# Altium schematic symbol library lib_datalogger.SchLib: 1246 symbols (part 10 of 16) (continued)
## CMP-013-00003-3 (continued)
PNP General-Purpose Amplifier, 40 V, 0.2 A, -55 to 150 degC, 3-Pin SOT23, RoHS, Tape and Reel; Manufacturer: ON Semiconductor; Power: 225mW; Frequency: 250MHz; hFE Min: 80; Vce Max: 400mV; Elements: 1; Packaging: TapeandReel; Max Operating Temperature: 150°C; Datasheet URL: http://www.onsemi.cn/pub_link/Collateral/MMBT3906LT1-D.PDF; Pins: 3; Package Quantity: 3000; Package Description: 3-Pin Small Outline Transistor, Body 2.9 x 1.3 mm, Pitch 0.95 mm; Mounting Technology: SM; Datasheet Version: Rev. 12, 10/2016; Package Reference: SOT-23 (318-08); RoHS Compliant: True; Min Operating Temperature: -55°C; Case/Package: TO-236-3
footprint ONSC-SOT-23-3-318-08_V (SOT23, 3-Leads, Body 3.04x1.4mm, Pitch 0.95mm)
pins: 1 B, 2 E, 3 C

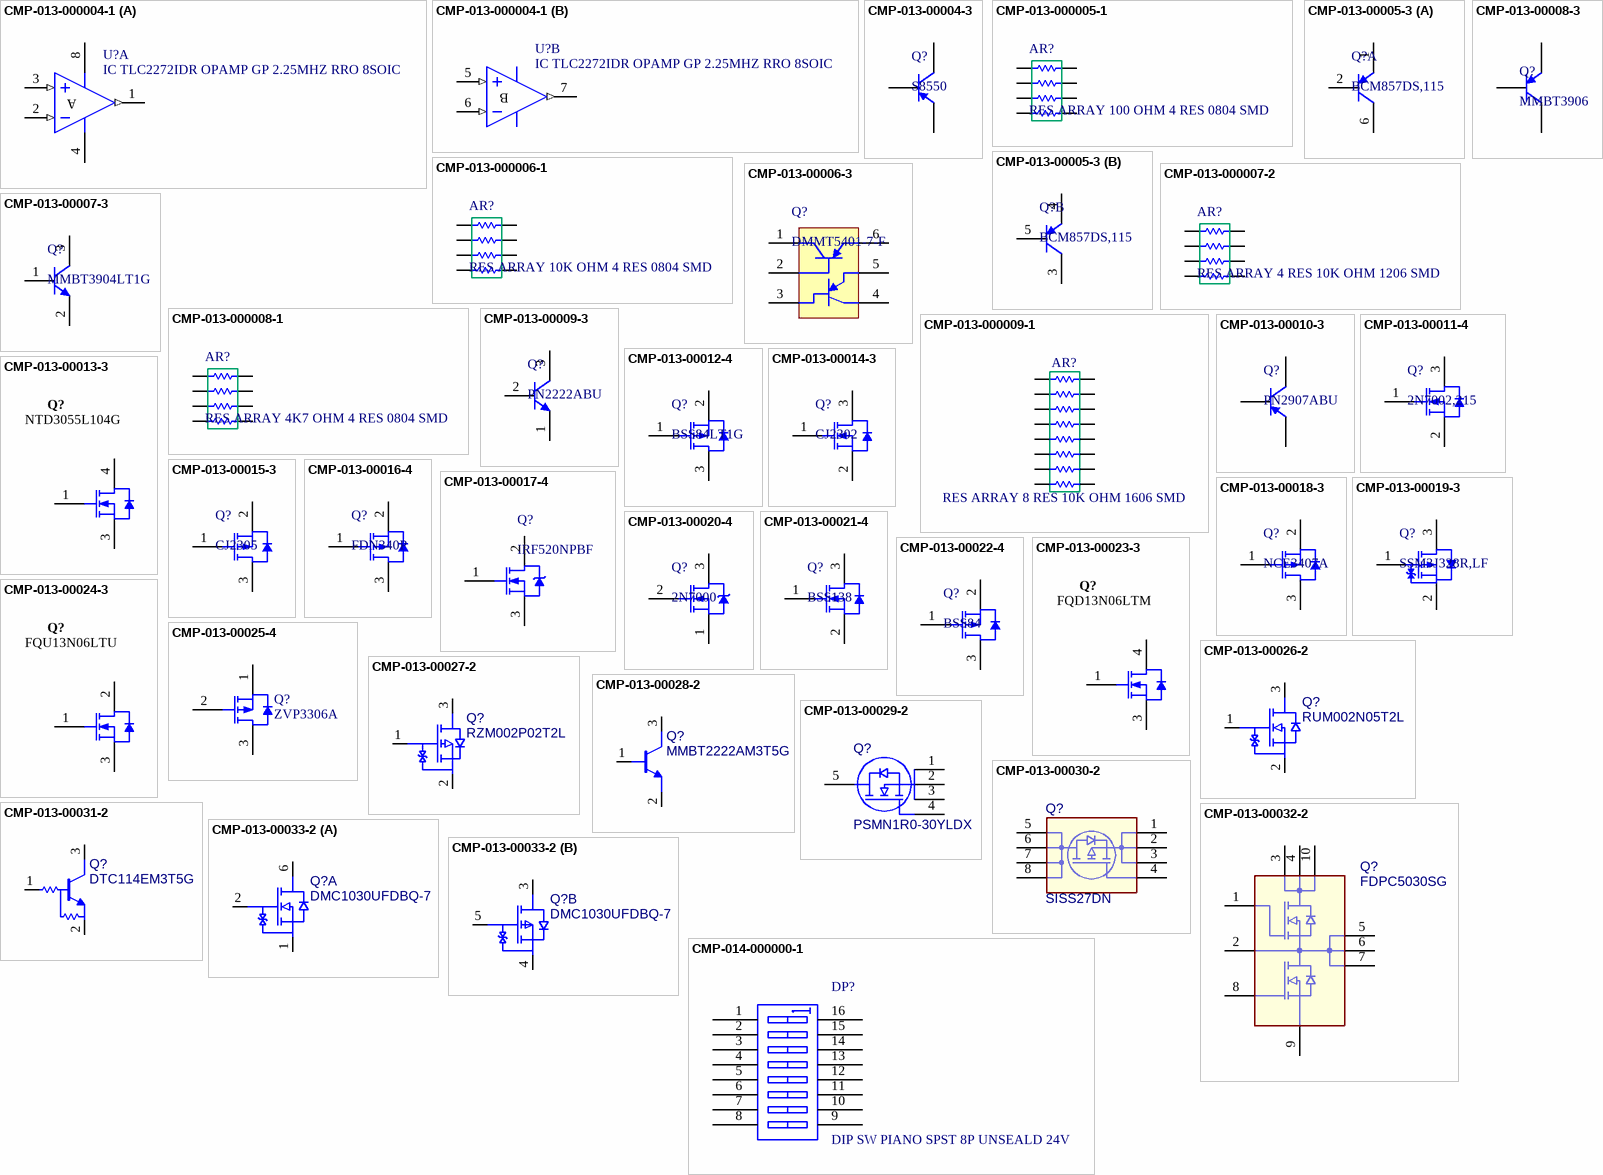
[diagram p29: symbols CMP-013-000004-1 to CMP-014-000000-1]

## CMP-013-000004-1
designator U?, comment IC TLC2272IDR OPAMP GP 2.25MHZ RRO 8SOIC
IC OPAMP GP 2.25MHZ RRO 8SOIC; Manufacturer: Texas Instruments; Amplifier Type: General Purpose; Voltage - Supply, Single/Dual (±): 4.4 V ~ 16 V, ±2.2 V ~ 8 V; Slew Rate: 3.6 V/µs; Output Type: Rail-to-Rail; Voltage - Input Offset: 300µV; Current - Output / Channel: 50mA; Number of Circuits: 2; Current - Input Bias: 1pA; Current - Supply: 2.4mA; ComponentLink1URL: http://www.ti.com/lit/ds/symlink/tlc2274.pdf; Part Status: Active; Packaging: Cut Tape (CT); Design Item ID: IC TLC2272IDR OPAMP GP 2.25MHZ RRO 8SOIC; Supplier Device Package: 8-SOIC; Manufacturer Part Number: TLC2272IDR; ComponentLink1Description: http://www.ti.com/lit/ds/symlink/tlc2274.pdf; Gain Bandwidth Product: 2.25MHz; Pricing 1: 1=1.75, 10=1.572, 100=1.2614, 500=1.0368, 1000=0.85824 (USD); Category: Integrated Circuits (ICs); Package / Case: 8-SOIC (0.154", 3.90mm Width); -3db Bandwidth: -; Operating Temperature: -40°C ~ 125°C; Mounting Type: Surface Mount; Stock 1: 3804; RoHS: RoHS Compliant; Source: mits.SchLib
footprint SOIC-8
footprint SOIC-8
part A pins: 1 1OUT (out), 2 1IN- (in), 3 1IN+ (in), 4 GND (power), 8 VCC (power)
part B pins: 5 2IN+ (in), 6 2IN- (in), 7 2OUT (out)
part A text: A
part B text: B

## CMP-013-00004-3
designator Q?, comment S8550
Low Voltage High Current Small Signal PNP Transistor, 20 V, 700 mA, 3-Pin TO-92, RoHS; Manufacturer: Unisonic; Mounting Technology: TH; Package Description: 3-Pin Through Hole Device, Dia 4.58 mm, Pitch 1.27 mm; Datasheet URL: http://media.nkcelectronics.com/datasheet/s8550.pdf; Case/Package: TO-92-3; Datasheet Version: Rev. E, 06/2014; Package Reference: TO-92-3; RoHS Compliant: Unknown
footprint UNIC-TO-92-3 (TO-92, 3-Leads, Dia 4.58mm, Pitch 1.27mm)
pins: 1 E, 2 B, 3 C

## CMP-013-000005-1
designator AR?, comment RES ARRAY 100 OHM 4 RES 0804 SMD
RES ARRAY 100 OHM 4 RES 0804; Manufacturer Part Number 1: YC124-FR-07100RL; Manufacturer 1: Yageo; Resistance: 100R; Tolerance: 1%; Number of Terminals/Pins: 8; Number of Resistors: 4; eVendorPrice: 0,0106; Temperature Coefficient: 200ppm/°C; Circuit Type: Isolated; Power Per Element: 62.5mW; eVendor: LCSC; Termination: Convex; Category: Resistor Arrays; Mount: Surface Mount; Terminal Pitch: 0.5mm; Depth: 1mm; Packaging: Tape and Reel; Design Item ID: RES ARRAY 100 OHM 4 RES 0804 SMD; Case/Package: 0804; RoHS Compliant: Yes; Lead Free: Lead Free; Observação: --; MOQ: 4600; Military Standard: Not; Source: mits.SchLib; Max Operating Temperature: 155°C; Min Operating Temperature: -55°C; Width: 0.039inch; Length: 0.079inch; Number of Circuits: 4; eVendor#: YC124-FR-07100RL; Height: 0.022inch; Part#: YC124-FR-07100RL; Number of Pins: 8
footprint Array_4Res-0804
footprint Array_4Res-0804
pins: 1, 2, 3, 4, 5, 6, 7, 8

## CMP-013-00005-3
designator Q?, comment BCM857DS,115
PNP/PNP Matched Double Transistors, 175 MHz, -65 to 150 degC, 6-Pin SOT457, RoHS, Tape and Reel; Manufacturer: NXP; Power: 380mW; Package Version: Feb-16; Vce Max: 400mV; hFE Min: 200; Tolerance: 5%; Frequency: 175MHz; Packaging: TapeandReel; Package Description: 6-Pin Small Outline Transistor, Body 2.9 x 1.5 mm, Pitch 0.95 mm; Max Operating Temperature: 150°C; Mounting Technology: SM; Case/Package: SOT-457; Pins: 6; Min Operating Temperature: -65°C; RoHS Compliant: True; Datasheet URL: http://cache.nxp.com/documents/data_sheet/BCM857BV_BS_DS.pdf?pspll=1; Datasheet Version: Rev. 06, 08/2009; Package Reference: SOT457-6; Package Quantity: 3000
footprint NXP-SOT457-6_V (SOT457, 6-Leads, Body 3.1x1.7mm, Pitch 0.95mm)
part A pins: 1 E1 "emitter TR1", 2 B1 "base TR1", 6 C1 "collector TR1"
part B pins: 3 C2 "collector TR2", 4 E2 "emitter TR2", 5 B2 "base TR2"

## CMP-013-000006-1
designator AR?, comment RES ARRAY 10K OHM 4 RES 0804 SMD
RES ARRAY 10K OHM 4 RES 0804; Part#: YC124-JR-0710KL; Manufacturer: Yageo; eVendor: Digi-Key; eVendor#: YC124J-10KCT-ND; MSRP: 0,00999; eVendorPrice: 0,10; Source: mits.SchLib; Datasheet: http://www.yageo.com/documents/recent/PYu-YC_TC124_51_RoHS_L_(3).pdf; Observação: --; MOQ: 5000; Design Item ID: RES ARRAY 10K OHM 4 RES 0804 SMD
footprint Array_4Res-0804
footprint Array_4Res-0804
pins: 1, 2, 3, 4, 5, 6, 7, 8

## CMP-013-00006-3
designator Q?, comment DMMT5401-7-F
Matched PNP Small Signal Surface Mount Transistor, 300 mW, -55 to 150 degC, 6-Pin SOT-26, RoHS, Tape and Reel; Manufacturer: Diodes Inc; Frequency: 300MHz; hFE Min: 60; Power: 300mW; Vce Max: 500mV; Elements: 2; Mounting Technology: SM; Package Quantity: 3000; Package Reference: SOT-26-6; Datasheet URL: http://www.diodes.com/_files/datasheets/ds30437.pdf; Min Operating Temperature: -55°C; Datasheet Version: Rev. 6-2, 05/2009; Pins: 6; Package Description: 6-Pin Small Outline Transistor, Body 1.6 x 3 mm, Pitch 0.95 mm; RoHS Compliant: True; Max Operating Temperature: 150°C; Case/Package: SOT-26; Packaging: TapeandReel
footprint DIOD-SOT-26-6_L (SOT23, 6-Leads, Body 3.1x1.7mm, Pitch 0.95mm, IPC High Density)
footprint DIOD-SOT-26-6_N (SOT23, 6-Leads, Body 3.1x1.7mm, Pitch 0.95mm, IPC Medium Density)
footprint DIOD-SOT-26-6_M (SOT23, 6-Leads, Body 3.1x1.7mm, Pitch 0.95mm, IPC Low Density)
pins: 1 C1, 2 B1, 3 B2, 4 C2, 5 E2, 6 E1

## CMP-013-000007-2
designator AR?, comment RES ARRAY 4 RES 10K OHM 1206 SMD
RES ARRAY 4 RES 10K OHM 1206; Manufacturer: Panasonic Electronic Components; Manufacturer Part Number: EXB-38V103JV; Power Per Element: 62.5mW; Tolerance: ±5%; Temperature Coefficient: ±200ppm/°C; Number of Resistors: 4; Circuit Type: Isolated; Package / Case: 1206 (3216 Metric), Convex, Long Side Terminals; Category: Resistors; Operating Temperature: -55°C ~ 125°C; Design Item ID: RES ARRAY 4 RES 10K OHM 1206 SMD; Mounting Type: Surface Mount; Size / Dimension: 0.126" L x 0.063" W (3.20mm x 1.60mm); Packaging: Cut Tape (CT); Part Status: Active; ComponentLink1URL: https://industrial.panasonic.com/cdbs/www-data/pdf/AOC0000/AOC0000CE4.pdf; Applications: Automotive AEC-Q200; Resistance (Ohms): 10k; Supplier Device Package: 1206; Stock 1: 318916; Number of Pins: 8; ComponentLink1Description: https://industrial.panasonic.com/cdbs/www-data/pdf/AOC0000/AOC0000CE4.pdf; RoHS: RoHS Compliant; Pricing 1: 1=0.1, 10=0.051, 25=0.0368, 50=0.0282, 100=0.0208, 250=0.01584, 500=0.01268, 1000=0.00933 (USD); Height - Seated (Max): 0.024" (0.60mm); Source: mits.SchLib
footprint Array_4Res-0804
footprint Array_4Res-1206
pins: 1, 2, 3, 4, 5, 6, 7, 8

## CMP-013-00007-3
designator Q?, comment MMBT3904LT1G
General Purpose Transistor, NPN Silicon, 40 V, 0.2 A, -55 to 150 degC, 3-Pin SOT23, RoHS, Tape and Reel; Manufacturer: ON Semiconductor; Elements: 1; Power: 225mW; Frequency: 300MHz; hFE Min: 80; Vce Max: 300mV; Mounting Technology: SM; Min Operating Temperature: -55°C; Datasheet URL: http://www.onsemi.cn/pub_link/Collateral/MMBT3904LT1-D.PDF; Pins: 3; Package Description: 3-Pin Small Outline Transistor, Body 2.9 x 1.3 mm, Pitch 0.95 mm; Max Operating Temperature: 150°C; Package Reference: SOT-23 (318-08); Package Quantity: 3000; RoHS Compliant: True; Packaging: TapeandReel; Datasheet Version: Rev. 12, 11/2012; Case/Package: TO-236-3
footprint ONSC-SOT-23-3-318-08_V (SOT23, 3-Leads, Body 3.04x1.4mm, Pitch 0.95mm)
pins: 1 B, 2 E, 3 C

## CMP-013-000008-1
designator AR?, comment RES ARRAY 4K7 OHM 4 RES 0804 SMD
RES ARRAY 4.7K OHM 4 RES 0804; Manufacturer: Yageo; Part#: YC124-JR-074K7L; MSRP: 0,00999; eVendorPrice: 0,10; eVendor#: YC124J-4.7KCT-ND; eVendor: Digi-Key; Design Item ID: RES ARRAY 4K7 OHM 4 RES 0804 SMD; Datasheet: http://www.yageo.com/documents/recent/PYu-YC_TC124_51_RoHS_L_(3).pdf; Observação: --; Source: mits.SchLib; MOQ: 5000
footprint Array_4Res-0804
footprint Array_4Res-0804
pins: 1, 2, 3, 4, 5, 6, 7, 8

## CMP-013-00008-3
designator Q?, comment MMBT3906
PNP General-Purpose Amplifier, 40 V, 0.2 A, -55 to 150 degC, 3-Pin SOT23, RoHS, Tape and Reel; Manufacturer: Fairchild; Power: 350mW; Elements: 1; Vce Max: 400mV; Package Version: Rev. 12, 03/2016; hFE Min: 100; Frequency: 250MHz; Package Reference: SOT23-3; Mounting Technology: SM; Datasheet URL: https://www.fairchildsemi.com/datasheets/MM/MMBT3906.pdf; RoHS Compliant: True; Min Operating Temperature: -55°C; Packaging: TapeandReel; Max Operating Temperature: 150°C; Datasheet Version: Rev. 1.2.2, 04/2014; Package Description: 3-Pin Small Outline Transistor, Body 2.92 x 1.325 mm, Pitch 0.95 mm; Package Quantity: 3000; Pins: 3; Case/Package: TO-236-3
footprint FAIR-SOT23-3_V (SOT23, 3-Leads, Body 3.12x1.5mm, Pitch 0.95mm)
pins: 1 B, 2 E, 3 C

## CMP-013-000009-1
designator AR?, comment RES ARRAY 8 RES 10K OHM 1606 SMD
RES ARRAY 8 RES 10K OHM 1606; Manufacturer: Rohm Semiconductor; Manufacturer Part Number: MNR18ERAPJ103; Number of Resistors: 8; Power Per Element: 62.5mW; Circuit Type: Isolated; Tolerance: ±5%; Temperature Coefficient: ±250ppm/°C; Size / Dimension: 0.157" L x 0.063" W (4.00mm x 1.60mm); ComponentLink1URL: http://rohmfs.rohm.com/en/products/databook/datasheet/passive/resistor/chip_resistor_network/mnr_g.pdf; Applications: -; Part Status: Active; RoHS: RoHS Compliant; Pricing 1: 1=0.11, 10=0.1, 25=0.0692, 50=0.054, 100=0.0385, 250=0.03004, 500=0.02388, 1000=0.01694 (USD); Resistance (Ohms): 10k; Category: Resistors; Number of Pins: 16; Design Item ID: RES ARRAY 8 RES 10K OHM 1606 SMD; Stock 1: 10849; Height - Seated (Max): 0.020" (0.50mm); Supplier Device Package: -; Package / Case: 1606, Convex, Long Side Terminals; Mounting Type: Surface Mount; Packaging: Cut Tape (CT); ComponentLink1Description: http://rohmfs.rohm.com/en/products/databook/datasheet/passive/resistor/chip_resistor_network/mnr_g.pdf; Source: mits.SchLib; Operating Temperature: -55°C ~ 125°C
footprint Array 8Res 1606
footprint Array 8Res 1606
pins: 1, 2, 3, 4, 5, 6, 7, 8, 9, 10, 11, 12, 13, 14, 15, 16

## CMP-013-00009-3
designator Q?, comment PN2222ABU
NPN General-Purpose Amplifier, 40 V, -55 to 150 degC, 3-Pin TO-92, RoHS, Bulk; Manufacturer: Fairchild; Power: 625mW; Elements: 1; hFE Min: 100; Vce Max: 1V; Frequency: 300MHz; Mounting Technology: TH; Package Quantity: 1000; RoHS Compliant: True; Datasheet Version: Rev. 1.1.0, 07/2014; Max Operating Temperature: 150°C; Min Operating Temperature: -55°C; Package Reference: TO-92; Package Description: 3-Pin Transistor Outline Package, Body Dia 4.79 mm, Pitch 1.27 mm; Pins: 3; Packaging: Bulk; Datasheet URL: https://www.fairchildsemi.com/datasheets/PN/PN2222A.pdf; Case/Package: TO-226-3
footprint FAIR-TO-92 (TO, 3-Leads, Body Dia 4.79mm, Pitch 1.27mm)
pins: 1 E, 2 B, 3 C

## CMP-013-00010-3
designator Q?, comment PN2907ABU
BJT PNP General Purpose Transistor, 60 V, 800 mA, -55 to 150 degC, 3-Pin TO-92, RoHS, Bulk; Manufacturer: Fairchild Semiconductor; Frequency: 200MHz; Power: 625mW; Vce Max: 1.6V; hFE Min: 100; Elements: 1; Package Quantity: 1000; Datasheet URL: http://datasheet.octopart.com/PN2907ABU-Fairchild-Semiconductor-datasheet-22973435.pdf; Datasheet Version: Rev. 1.1.2, 01/2014; Package Reference: TO-92; RoHS Compliant: True; Mounting Technology: TH; Max Operating Temperature: 150°C; Case/Package: TO-226-3; Min Operating Temperature: -55°C; Package Description: 3-Pin Transistor Outline Package, Body Dia 4.79 mm, Pitch 1.27 mm; Packaging: Bulk; Pins: 3
footprint FAIR-TO-92 (TO, 3-Leads, Body Dia 4.79mm, Pitch 1.27mm)
pins: 1 E, 2 B, 3 C

## CMP-013-00011-4
designator Q?, comment 2N7002,215
N-channel Trench MOSFET, 60 V, 300 mA, -65 to 150 degC, 3-Pin SOT-23 (TO-236AB), RoHS, Tape and Reel; Manufacturer: NXP Semiconductors; Elements: 1; Power: 830mW; Max Dual Supply Voltage: 60V; Rds On Max: 5Ohm; Package Version: Feb-16; Nominal Vgs: 2V; Input Capacitance: 50pF; RoHS Compliant: True; Datasheet URL: http://www.nxp.com/documents/data_sheet/2N7002.pdf; Packaging: TapeandReel; Case/Package: TO-236-3; Package Reference: SOT23-3; Max Operating Temperature: 150°C; Pins: 8; Mounting Technology: SM; Package Quantity: 1; Datasheet Version: Rev. 7, 09/2011; Nominal Dual Supply Voltage: 60V; Min Operating Temperature: -65°C; Package Description: 3-Pin Small Outline Transistor, Body 1.3 x 2.9 mm, Pitch 0.95 mm; Vds Max: 60V
footprint NXP-SOT23-3_V (SOT23, 3-Leads, Body 2.9x1.3mm, Pitch 0.95mm)
pins: 1 G, 2 S, 3 D

## CMP-013-00012-4
designator Q?, comment BSS84LT1G
Power MOSFET Single P-Channel, -50 V, 10 Ohm, 3-Pin SOT-23, Pb-Free, Tape and Reel; Manufacturer: ON Semiconductor; Elements: 1; Power: 225mW; Nominal Vgs: -10V; Nominal Dual Supply Voltage: 5V; Typical Rise Time: 1ns; Input Capacitance: 30pF; Rds On Max: 10Ohm; RoHS Compliant: True; Mounting Technology: SM; Package Quantity: 3000; Min Operating Temperature: -55°C; Case/Package: SOT-23-3; Packaging: TapeandReel; Package Description: 3-Pin Small Outline Transistor, Body 2.9 x 1.3 mm, Pitch 0.95 mm; Datasheet Version: Rev. 9, 10/2016; Pins: 3; Datasheet URL: http://www.onsemi.com/pub_link/Collateral/BSS84LT1-D.PDF; Max Operating Temperature: 150°C; Package Reference: SOT-23 (318-08)
footprint ONSC-SOT-23-3-318-08_V (SOT23, 3-Leads, Body 3.04x1.4mm, Pitch 0.95mm)
pins: 1 GATE, 2 SOURCE, 3 DRAIN

## CMP-013-00013-3
designator Q?, comment NTD3055L104G
Logic Level N-Channel Power MOSFET, 12 A, 60 V, -55 to 175 degC, 3-Pin DPAK, Pb-Free, Tube; Manufacturer: ON Semiconductor; Typical Rise Time: 104ns; Power: 48W; Input Capacitance: 440pF; Elements: 1; Rds On Max: 104mohm; Pins: 3; Datasheet URL: http://www.onsemi.cn/pub_link/Collateral/NTD3055L104-D.PDF; Datasheet Version: Rev. 10, 09/2016; Min Operating Temperature: -55°C; Package Quantity: 75; Mounting Technology: SM; Package Description: 3-Pin Transistor Outline, Body 6.54 x 6.095 mm, Pitch 2.29 mm; RoHS Compliant: True; Max Operating Temperature: 175°C; Packaging: Rail/Tube; Package Reference: DPAK-3-369C; Case/Package: DPAK
footprint ONSC-DPAK-3-369C_V (DPAK, 3-Leads, Body 6.22x6.75mm, Pitch 2.29mm)
pins: 1 G, 3 S, 4 D

## CMP-013-00014-3
designator Q?, comment CJ2302
N-Channe Plastic Encapsulate MOSFET, 20 V, 2.1 A, 3-Pin SOT23, Tape and Reel; Manufacturer: Jiangsu Changjiang Electronics Technology; Package Version: Rev. E, 09/2009; Package Reference: SOT23-3; Mounting Technology: SM; Datasheet Version: Rev. D, 08/2015; RoHS Compliant: Unknown; Package Description: 3-Pin Small Outline Transistor, Body 2.9 x 1.3 mm, Pitch 0.95 mm; Datasheet URL: http://www.cj-elec.com/gallery/txUpfile/9c19fa03e8d43801a6647d386a41a240.pdf; Case/Package: SOT23-3
footprint JSCJ-SOT23-3_V (SOT23, 3-Leads, Body 3x1.4mm, Pitch 0.95mm)
pins: 1 G, 2 S, 3 D

## CMP-013-00015-3
designator Q?, comment CJ2305
P-Channel Plastic Encapsulate MOSFET, 12 V, 4.1 A, 3-Pin SOT23, Tape and Reel; Manufacturer: Jiangsu Changjiang Electronics Technology; Package Version: Rev. E, 09/2009; Datasheet URL: http://www.cj-elec.com/gallery/txUpfile/5140ba9ed47d18467ea4bddc055cd747.pdf; Case/Package: SOT23-3; Mounting Technology: SM; RoHS Compliant: Unknown; Datasheet Version: Rev. F, 04/2015; Package Description: 3-Pin Small Outline Transistor, Body 2.9 x 1.3 mm, Pitch 0.95 mm; Package Reference: SOT23-3
footprint JSCJ-SOT23-3_V (SOT23, 3-Leads, Body 3x1.4mm, Pitch 0.95mm)
pins: 1 GATE, 2 SOURCE, 3 DRAIN

## CMP-013-00016-4
designator Q?, comment FDN340P
Single P-Channel, Logic Level, PowerTrench(R) MOSFET, 2 A, 20 V, -55 to 150 degC, 3-Pin SOT-23, RoHS, Tape and Reel; Manufacturer: Fairchild Semiconductor; Package Version: Rev. 3, 05/2015; Nominal Vgs: -800mV; Power: 500mW; Nominal Dual Supply Voltage: -20V; Typical Rise Time: 9ns; Elements: 1; Rds On Max: 70mohm; Input Capacitance: 779pF; Package Reference: SSOT3L; Min Operating Temperature: -55°C; RoHS Compliant: True; Package Description: 3-Pin Small Outline Transistor, Body 2.92 x 1.4 mm, Pitch 0.95 mm; Pins: 3; Datasheet Version: Rev. E1, 02/2007; Mounting Technology: SM; Package Quantity: 3000; Packaging: TapeandReel; Max Operating Temperature: 150°C; Datasheet URL: https://www.fairchildsemi.com/datasheets/FD/FDN340P.pdf; Case/Package: TO-236-3
footprint FAIR-SSOT3L-3_V (SOT23, 3-Leads, Body 2.92x1.4mm, Pitch 0.95mm)
pins: 1 GATE, 2 SOURCE, 3 DRAIN

## CMP-013-00017-4
designator Q?, comment IRF520NPBF
HEXFET(R) Power MOSFET, 100 V, 9.7 A, 0.2 Ohm, -55 to 175 degC, 3-Pin FM (TO-220AB), RoHS, Tube; Manufacturer: International Rectifier; Power: 48W; Elements: 1; Typical Rise Time: 23ns; Nominal Dual Supply Voltage: 100V; Rds On Max: 200mohm; Input Capacitance: 330pF; Nominal Vgs: 4V; Package Reference: TO-220AB; Max Operating Temperature: 175°C; Datasheet Version: Nov-03; Datasheet URL: http://www.infineon.com/dgdl/irf520npbf.pdf?fileId=5546d462533600a4015355e340711985; Package Quantity: 50; Package Description: 3-Pin Flange Mount, Body 4.445 x 10.415 mm, Pitch 2.54 mm; Pins: 3; Packaging: Rail/Tube; RoHS Compliant: True; Min Operating Temperature: -55°C; Case/Package: TO-220-3; Mounting Technology: TH
footprint INTR-TO-220AB-3 (FM, 3-Leads, Body 10.55x4.7mm, Pitch 2.54mm)
pins: 1 G, 2 D, 3 S

## CMP-013-00018-3
designator Q?, comment NCE3407A
P-Channel Enhancement Mode Power MOSFET, 30 V, 4.3 A, - 55 to 150 degC, 3-Pin SOT23, RoHS, Tape and Reel; Manufacturer: NCE Power; Datasheet Version: Rev. 1.1, 07/2014; Case/Package: SOT23-3; Mounting Technology: SM; Datasheet URL: http://www.ncepower.com/Upload/MOSFET/mos1/55vpmos/NCE3407Adatasheet-17275285683.pdf; Package Reference: SOT23-3; Package Description: 3-Pin Small Outline Transistor, Body 2.9 x 1.3 mm, Pitch 0.95 mm; RoHS Compliant: Unknown
footprint NCEP-SOT23-3_M (SOT23, 3-Leads, Body 3x1.4mm, Pitch 0.95mm, IPC Low Density)
footprint NCEP-SOT23-3_L (SOT23, 3-Leads, Body 3x1.4mm, Pitch 0.95mm, IPC High Density)
footprint NCEP-SOT23-3_N (SOT23, 3-Leads, Body 3x1.4mm, Pitch 0.95mm, IPC Medium Density)
pins: 1 GATE, 2 SOURCE, 3 DRAIN

## CMP-013-00019-3
designator Q?, comment SSM3J328R,LF
TOSHIBA Field-Effect Transistor Silicon P-Channel MOS Type (U-MOS?), 20 V, -55 to 125 degC, 3-Pin SOTFL, RoHS, Tape and Reel; Input Capacitance: 840pF; Capacitance: -23f; Rds On Max: 29.8mohm; Package Description: 3-Pin Small Outline Transistor, Flat Lead, Body 2.9 x 1.8 mm, Pitch 0.95 mm; Case/Package: SOT-23-3; Package Reference: SOT-23F; RoHS Compliant: True; Manufacturer: Toshiba; Max Operating Temperature: 150°C; Pins: 3; Package Quantity: 1; Datasheet URL: https://toshiba.semicon-storage.com/info/docget.jsp?did=2429&prodName=SSM3J328R; Packaging: CutTape; Datasheet Version: Mar-14; Mounting Technology: SM; Min Operating Temperature: -55°C
footprint TOSH-SOT-23F_V (SOTFL, 3-Leads, Body 3.1x1.9mm, Pitch 0.95mm)
pins: 1 G, 2 S, 3 D

## CMP-013-00020-4
designator Q?, comment 2N7000
Small Signal MOSFET, 200 mA, 60 V, N-Channel, 3-Pin TO-92, Bulk Box; Manufacturer: Fairchild Semiconductor; Input Capacitance: 50pF; Power: 400mW; Rds On Max: 5Ohm; Nominal Dual Supply Voltage: 60V; Elements: 1; Package Version: Rev. AM; Nominal Vgs: 2.1V; RoHS Compliant: True; Mounting Technology: TH; Max Operating Temperature: 150°C; Package Quantity: 2000; Package Reference: TO-92-3-29-11_AM_BL; Datasheet Version: Rev. 8, 04/2011; Package Description: 3-Pin Transistor Outline, Body 4.825 x 3.685 mm, Pitch 1.27 mm; Packaging: Bulk; Min Operating Temperature: -55°C; Case/Package: TO-92; Datasheet URL: http://www.onsemi.com/pub_link/Collateral/2N7000-D.PDF; Pins: 3
footprint ONSC-TO-92-3-29-11_AM_BL (TO, 3-Leads, Body Dia 4.7mm, Pitch 2.6mm)
pins: 1 S, 2 G, 3 D

## CMP-013-00021-4
designator Q?, comment BSS138
N-Channel Logic Level Enhancement Mode Field Effect Transistor, 220 mA, 50 V, -55 to 150 degC, 3-Pin SOT-23, RoHS, Tape and Reel; Manufacturer: Fairchild; Elements: 1; Nominal Vgs: 1.3V; Resistance: 0.7Ohm; Typical Rise Time: 9ns; Rds On Max: 3.5Ohm; Nominal Dual Supply Voltage: 50V; Input Capacitance: 27pF; Package Version: Rev. 12, 03/2016; Power: 360mW; Packaging: TapeandReel; Package Description: 3-Pin Small Outline Transistor, Body 2.92 x 1.325 mm, Pitch 0.95 mm; Datasheet URL: https://www.fairchildsemi.com/datasheets/BS/BSS138.pdf; Min Operating Temperature: -55°C; Pins: 3; RoHS Compliant: True; Package Reference: SOT23-3; Package Quantity: 1; Case/Package: TO-236-3; Mounting Technology: SM; Max Operating Temperature: 150°C; Datasheet Version: Rev. C, 10/2005
footprint FAIR-SOT23-3_V (SOT23, 3-Leads, Body 3.12x1.5mm, Pitch 0.95mm)
pins: 1 G, 2 S, 3 D

## CMP-013-00022-4
designator Q?, comment BSS84
P-Channel Enhancement Mode Field-Effect Transistor, 0.13 A, 50 V, -55 to 150 degC, 3-Pin SOT23, RoHS, Tape and Reel; Manufacturer: Fairchild; Nominal Vgs: -1.7V; Typical Rise Time: 6.3ns; Input Capacitance: 73pF; Rds On Max: 10Ohm; Elements: 1; Package Version: Rev. 12, 03/2016; Nominal Dual Supply Voltage: -50V; Power: 360mW; Package Quantity: 3000; Mounting Technology: SM; Package Reference: SOT23-3; Case/Package: TO-236-3; Package Description: 3-Pin Small Outline Transistor, Body 2.92 x 1.325 mm, Pitch 0.95 mm; Datasheet URL: https://www.fairchildsemi.com/datasheets/BS/BSS84.pdf; Packaging: TapeandReel; Max Operating Temperature: 150°C; Min Operating Temperature: -55°C; Pins: 3; Datasheet Version: Rev. 1.1.0, 02/2013; RoHS Compliant: True
footprint FAIR-SOT23-3_V (SOT23, 3-Leads, Body 3.12x1.5mm, Pitch 0.95mm)
pins: 1 GATE, 2 SOURCE, 3 DRAIN

## CMP-013-00023-3
designator Q?, comment FQD13N06LTM
N-Channel QFET(R) MOSFET, 11 A, 60 V, 115 mOhm, -55 to 150 degC, 3-Pin DPAK (TO-252), RoHS, Tape and Reel; Manufacturer: Fairchild; Power: 2.5W; Elements: 1; Typical Rise Time: 90ns; Package Version: Rev. 11, 05/2016; Input Capacitance: 350pF; Packaging: TapeandReel; Package Quantity: 2500; Mounting Technology: SM; Pins: 3; Max Operating Temperature: 150°C; Package Reference: TO-252; Case/Package: TO-252-3; Datasheet Version: Rev. 1.7, 07/2016; RoHS Compliant: True; Rds On Max: 115mohm; Package Description: 3-Pin Transistor Outline, Body 6.54 x 6.095 mm, Pitch 2.28 mm; Datasheet URL: https://www.fairchildsemi.com/datasheets/FQ/FQD13N06L.pdf; Min Operating Temperature: -55°C
footprint FAIR-TO-252-3_V (D-PAK, 3-Leads, Body 6.22x6.73mm, Pitch 2.28mm)
pins: 1 G, 3 S, 4 D

## CMP-013-00024-3
designator Q?, comment FQU13N06LTU
N-Channel QFET(R) MOSFET, 11 A, 60 V, 115 mOhm, -55 to 150 degC, 3-Pin TO-251, RoHS, Tube; Manufacturer: Fairchild; Input Capacitance: 350pF; Typical Rise Time: 90ns; Elements: 1; Power: 2.5W; Package Quantity: 70; Case/Package: TO-251-3; Max Operating Temperature: 150°C; Rds On Max: 115mohm; Pins: 3; Datasheet Version: Rev. 1.7, 07/2016; Mounting Technology: TH; RoHS Compliant: True; Min Operating Temperature: -55°C; Package Reference: TO-251-3; Datasheet URL: https://www.fairchildsemi.com/datasheets/FQ/FQU13N06L.pdf; Packaging: Rail/Tube; Package Description: 3-Pin Flange Mount, Body 6.575 x 2.3 mm, Pitch 2.29 mm
footprint FAIR-TO-251-3 (FM, 3-Leads, Body 6.8x2.5mm, Pitch 2.29mm)
pins: 1 G, 2 D, 3 S

## CMP-013-00025-4
designator Q?, comment ZVP3306A
P-Channel Enhancement Mode Vertical DMOS FET, 60 VDS, 3-Pin TO92, RoHS, Bulk; Manufacturer: Diodes Inc; Elements: 1; Nominal Dual Supply Voltage: -60V; Input Capacitance: 50pF; Nominal Vgs: -3.5V; Power: 625mW; Typical Rise Time: 8ns; Rds On Max: 14Ohm; RoHS Compliant: True; Case/Package: TO-226-3; Pins: 3; Datasheet URL: http://www.diodes.com/_files/datasheets/ZVP3306A.pdf; Package Quantity: 4000; Package Description: 3-Pin Transistor Outline Package, Body Dia 4.57 mm, Pitch 1.27 mm; Datasheet Version: Rev. 2, 03/1994; Package Reference: TO92-3; Min Operating Temperature: -55°C; Mounting Technology: TH; Max Operating Temperature: 150°C; Packaging: Bulk
footprint DIOD-TO92-3 (TO, 3-Leads, Body Dia 4.57mm, Pitch 1.27mm)
pins: 1 S, 2 G, 3 D

## CMP-013-00026-2
designator Q?, comment RUM002N05T2L
Nch Small Signal MOSFET, 50 V, 200 mA, 3-Pin SOT723, RoHS, Tape and Reel; Vgs(th) (Max) @ Id: 1V@1mA; Pins: 3
footprint ROHM-SOT723-3_V (SOT723, 3-Leads, Body 1.2x0.8mm, Pitch 0.8mm)
footprint ROHM-SOT723-3_V (SOT723, 3-Leads, Body 1.2x0.8mm, Pitch 0.8mm)
pins: 1 G, 2 S, 3 D

## CMP-013-00027-2
designator Q?, comment RZM002P02T2L
Pch Small Signal MOSFET, 20 V, 200 mA, 3-Pin SOT723, RoHS, Tape and Reel; Vgs(th) (Max) @ Id: 1V@100µA; Pins: 3
footprint ROHM-SOT723-3_V (SOT723, 3-Leads, Body 1.2x0.8mm, Pitch 0.8mm)
footprint ROHM-SOT723-3_V (SOT723, 3-Leads, Body 1.2x0.8mm, Pitch 0.8mm)
pins: 1 G, 2 S, 3 D

## CMP-013-00028-2
designator Q?, comment MMBT2222AM3T5G
NPN General Purpose Transistor, 3-Pin SOT-723, Pb-Free, Tape and Reel; ComponentLink3Description: Package Specification; ComponentLink1URL: http://www.onsemi.com/; ComponentLink3URL: http://www.onsemi.com/pub_link/Collateral/631AA.PDF; ComponentLink2Description: Datasheet; Mounting Technology: SMT; Pins: 3; Case/Package: SOT-723; RoHS Compliant: TRUE; ComponentLink1Description: Manufacturer URL; ComponentLink2URL: http://www.onsemi.cn/pub_link/Collateral/MMBT2222AM3-D.PDF
footprint ROHM-SOT723-3_V (SOT723, 3-Leads, Body 1.2x0.8mm, Pitch 0.8mm)
footprint ROHM-SOT723-3_V (SOT723, 3-Leads, Body 1.2x0.8mm, Pitch 0.8mm)
pins: 1 B, 2 E, 3 C

## CMP-013-00029-2
designator Q?, comment PSMN1R0-30YLDX
N-channel Logic Level MOSFET, 30 V, 300 A, -55 to 175 degC, 5-Pin SOT669, RoHS, Tape and Reel; Vgs (Max): 20V; Transistor Type: 1N-Channel; RoHS Compliant: True; Pins: 5
footprint NXP-SOT669_L (DPAK, 4-Leads, Body 5x4.1mm, Pitch 1.27mm, IPC High Density)
footprint NXP-SOT669_L (DPAK, 4-Leads, Body 5x4.1mm, Pitch 1.27mm, IPC High Density)
pins: 1 S, 2 S, 3 S, 4 G, 5 D

## CMP-013-00030-2
designator Q?, comment SISS27DN
P-Channel (D-S) MOSFET, 30 V, 50 A, -50 to 150 degC, 8-Pin PowerPAK1212, RoHS, Tape and Reel; Vgs(th) (Max) @ Id: 2.2V@250µA; Pins: 8
footprint VISH-PPAK1212-8_V (SMD, 8-Leads, Body 3.21x3.21mm, Pitch 0.66mm)
footprint VISH-PPAK1212-8_V (SMD, 8-Leads, Body 3.21x3.21mm, Pitch 0.66mm)
pins: 1 S, 2 S, 3 S, 4 G, 5 D, 6 D, 7 D, 8 D

## CMP-013-00031-2
designator Q?, comment DTC114EM3T5G
Digital Transistor (BRT), R1=10 kOhm, R2=10 kOhm, NPN Transistor, 3-Pin SOT-723, Pb-Free, Tape and Reel; ComponentLink3URL: http://www.onsemi.com/pub_link/Collateral/631AA.PDF; Pins: 3; ComponentLink2URL: http://www.onsemi.cn/pub_link/Collateral/DTC114E-D.PDF; ComponentLink3Description: Package Specification; ComponentLink1URL: http://www.onsemi.com/; RoHS Compliant: TRUE; ComponentLink1Description: Manufacturer URL; Mounting Technology: SMT; Case/Package: SOT-723; ComponentLink2Description: Datasheet
footprint ROHM-SOT723-3_V (SOT723, 3-Leads, Body 1.2x0.8mm, Pitch 0.8mm)
footprint ROHM-SOT723-3_V (SOT723, 3-Leads, Body 1.2x0.8mm, Pitch 0.8mm)
pins: 1 B, 2 E, 3 C

## CMP-013-00032-2
designator Q?, comment FDPC5030SG
Asymmetric Dual N-Channel PowerTrench® Power Clip MOSFET, 30 V, -55 to 150 degC, 8-Pin PQFN, RoHS, Tape and Reel; Pins: 10
footprint ONSC-PQFN-8_V (QFN, 8-Leads, Body 5x6mm, Pitch 1.27mm)
footprint ONSC-PQFN-8_V (QFN, 8-Leads, Body 5x6mm, Pitch 1.27mm)
pins: 1 HSG, 2 GR, 3 HSD, 4 HSD, 5 SW, 6 SW, 7 SW, 8 LSG, 9 LSS, 10 HSD